# Altium footprint library 方林 封装库.PcbLib: 101 footprints (part 5 of 7)
Each footprint in its own frame and in the unit in brackets; x right, y up, seen from the top. Pads: shape width x height; smd on the part's side, far side on the other; paste and mask are expansions set on the pad; w line width, h text height; cw(c..) or ccw(c..) is an arc to the next point about the centre after c.
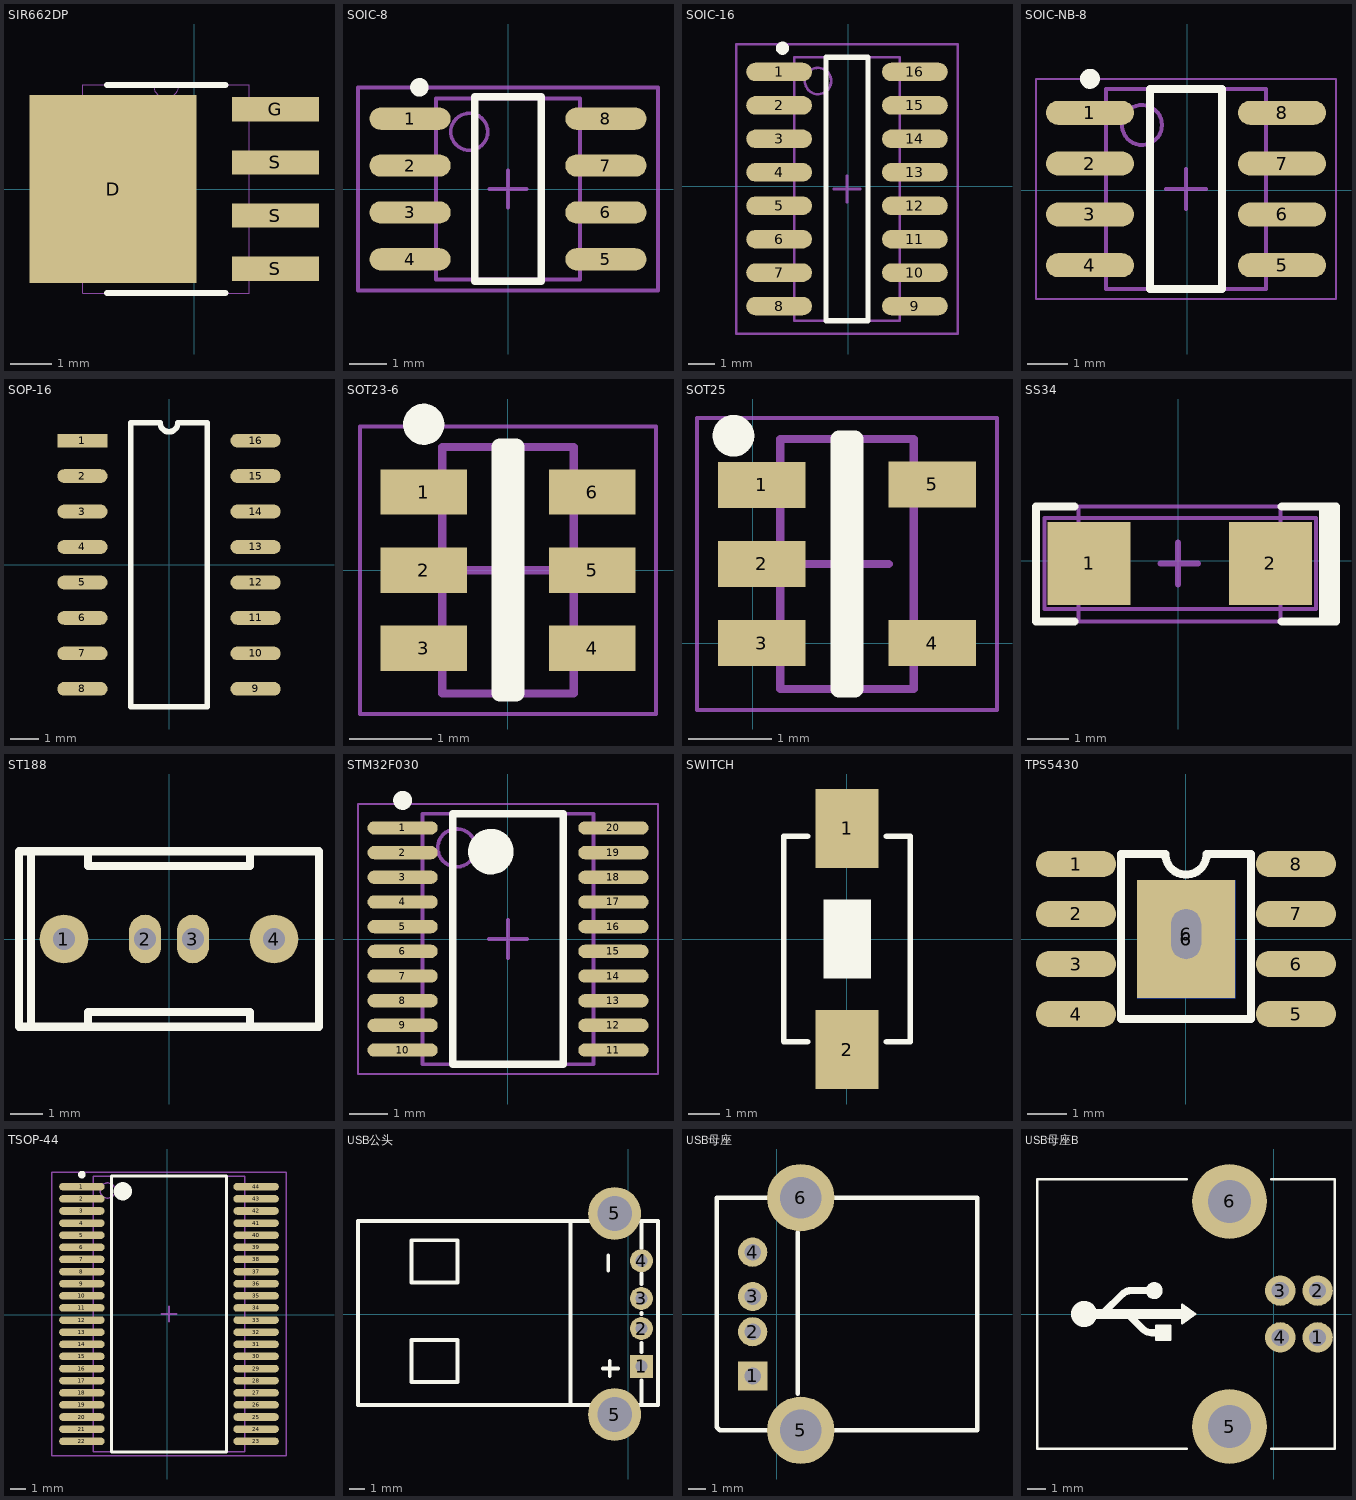
[diagram p4: the footprints below, top view; thin cyan lines are the x and y axes]

## SIR662DP [mil]
pads (5):
  rect 157.48x177.17 smd: D(-76.5,0)
  rect 82x23 smd: G(76.5,75) S(76.5,-75) S(76.5,-25) S(76.5,25)
Top Overlay:
  lines w6: -82.23,-98 29.23,-98 ; -82.23,98 29.23,98
Mechanical 1:
  lines w0: -38.5,98 ccw(c-26.5,98) -14.5,98 ; -148.5,65.5 -148.5,84.5 -105,84.5 -105,65.5 -148.5,65.5 ; -105,-98 52,-98 52,98 -105,98 -105,-98 ; 52,-84.5 52,-65.5 95.5,-65.5 95.5,-84.5 52,-84.5 ; 52,-34.5 52,-15.5 95.5,-15.5 95.5,-34.5 52,-34.5 ; 52,15.5 52,34.5 95.5,34.5 95.5,15.5 52,15.5 ; 52,65.5 52,84.5 95.5,84.5 95.5,65.5 52,65.5

## SOIC-8 [mm]
pads (8):
  oval 2.2x0.6 smd: 1(-2.654,1.905) 2(-2.654,0.635) 3(-2.654,-0.635) 4(-2.654,-1.905) 5(2.654,-1.905) 6(2.654,-0.635) 7(2.654,0.635) 8(2.654,1.905)
Top Overlay:
  circle w0.25: c-2.4,2.755 r0.125
  lines w0.2: -0.9,-2.5 -0.9,2.5 0.9,2.5 0.9,-2.5 -0.9,-2.5
Mechanical 13:
  circle w0.1: c-1.05,1.55 r0.5
  lines w0.1: -1.95,-2.45 -1.95,2.45 1.95,2.45 1.95,-2.45 -1.95,-2.45
Mechanical 15:
  lines w0.1: -0.5,0 0.5,0 ; 0,-0.5 0,0.5 ; -4.064,-2.75 -4.064,2.75 4.064,2.75 4.064,-2.75 -4.064,-2.75
3D body "SO-8.STEP": height 1.7, standoff 0, extent -3,-2.45 3,2.45

## SOIC-16 [mm]
pads (16):
  oval 2.5x0.7 smd: 1(-2.628,4.343) 2(-2.628,3.073) 3(-2.628,1.803) 4(-2.628,0.533) 5(-2.628,-0.737) 6(-2.628,-2.007) 7(-2.628,-3.277) 8(-2.628,-4.547) 9(2.526,-4.547) 10(2.526,-3.277) 11(2.526,-2.007) 12(2.526,-0.737) 13(2.526,0.533) 14(2.526,1.803) 15(2.526,3.073) 16(2.526,4.343)
Top Overlay:
  circle w0.25: c-2.501,5.243 r0.125
  lines w0.2: -0.851,-5.102 -0.851,4.898 0.749,4.898 0.749,-5.102 -0.851,-5.102
Mechanical 13:
  circle w0.1: c-1.151,3.998 r0.5
  lines w0.1: -2.051,-5.102 -2.051,4.898 1.949,4.898 1.949,-5.102 -2.051,-5.102
Mechanical 15:
  lines w0.1: -0.551,-0.102 0.449,-0.102 ; -0.051,-0.602 -0.051,0.398 ; -4.251,-5.602 -4.251,5.398 4.149,5.398 4.149,-5.602 -4.251,-5.602
3D body "User Library-SOIC16-150.STEP": height 1.75, standoff 0, extent -2.93,-5.025 2.87,4.775

## SOIC-NB-8 [mm]
pads (8):
  oval 2.2x0.6 smd: 1(-2.425,1.93) 2(-2.425,0.66) 3(-2.425,-0.61) 4(-2.425,-1.88) 5(2.375,-1.88) 6(2.375,-0.61) 7(2.375,0.66) 8(2.375,1.93)
Top Overlay:
  circle w0.25: c-2.425,2.78 r0.125
  lines w0.2: -0.925,-2.475 -0.925,2.525 0.875,2.525 0.875,-2.475 -0.925,-2.475
Mechanical 13:
  circle w0.1: c-1.125,1.625 r0.5
  lines w0.1: -2.025,-2.475 -2.025,2.525 1.975,2.525 1.975,-2.475 -2.025,-2.475
Mechanical 15:
  lines w0.05: -3.775,-2.725 -3.775,2.775 3.725,2.775 3.725,-2.725 -3.775,-2.725
  lines w0.1: -0.525,0.025 0.475,0.025 ; -0.025,-0.475 -0.025,0.525
3D body: height 2.65, standoff 0.1, extent -2.025,-2.475 1.975,2.525

## SOP-16 [mm]
pads (16):
  rect 1.8x0.49 smd: 1(-3.1,4.445)
  oval 1.8x0.49 smd: 2(-3.1,3.175) 3(-3.1,1.905) 4(-3.1,0.635) 5(-3.1,-0.635) 6(-3.1,-1.905) 7(-3.1,-3.175) 8(-3.1,-4.445) 9(3.1,-4.445) 10(3.1,-3.175) 11(3.1,-1.905) 12(3.1,-0.635) 13(3.1,0.635) 14(3.1,1.905) 15(3.1,3.175) 16(3.1,4.445)
Top Overlay:
  lines w0.2: -1.365,-5.08 -1.365,5.08 -0.318,5.08 ccw(c0,5.08) 0.317,5.08 1.365,5.08 1.365,-5.08 -1.365,-5.08
3D body: height 1, standoff 0, extent -2.565,-5.105 2.489,5.309

## SOT23-6 [mm]
pads (6):
  rect 1.05x0.55 smd: 1(-1.025,0.95) 2(-1.025,0) 3(-1.025,-0.95) 4(1.025,-0.95) 5(1.025,0) 6(1.025,0.95)
Top Overlay:
  circle w0.25: c-1.025,1.775 r0.125
  lines w0.2: -0.1,-1.5 -0.1,1.5 0.1,1.5 0.1,-1.5 -0.1,-1.5
Mechanical 13:
  lines w0.1: -0.8,-1.5 0.8,-1.5 0.8,1.5 -0.8,1.5 -0.8,-1.5
Mechanical 15:
  lines w0.05: -1.8,-1.75 1.8,-1.75 1.8,1.75 -1.8,1.75 -1.8,-1.75
  lines w0.1: -0.5,0 0.5,0 ; 0,-0.5 0,0.5
3D body: height 1.1, standoff 0.05, extent -0.8,-1.5 0.8,1.5

## SOT25 [mm]
pads (5):
  rect 1.05x0.55 smd: 1(0.109,1.9) 2(0.109,0.95) 3(0.109,0) 4(2.159,0) 5(2.159,1.905)
Top Overlay:
  circle w0.25: c-0.229,2.489 r0.125
  lines w0.2: 1.034,-0.55 1.234,-0.55 1.234,2.45 1.034,2.45 1.034,-0.55
Mechanical 13:
  lines w0.1: 0.334,-0.55 1.934,-0.55 1.934,2.45 0.334,2.45 0.334,-0.55
Mechanical 15:
  lines w0.05: -0.666,-0.8 -0.666,2.7 2.934,2.7 2.934,-0.8 -0.666,-0.8
  lines w0.1: 0.634,0.95 1.634,0.95 ; 1.134,0.45 1.134,1.45
3D body: height 1.1, standoff 0.05, extent 0.334,-0.55 1.934,2.45

## SS34 [mm] "肖特基二极管"
pads (2):
  rect 2x2 smd: 1(-2.152,-0.062) 2(2.223,-0.062)
Top Overlay:
  lines w0.2: -2.502,-1.462 -3.431,-1.462 -3.431,1.313 -2.502,1.313 ; 2.498,-1.462 3.504,-1.462 ; 2.498,1.313 3.504,1.313 ; 3.504,-1.462 3.805,-1.462 ; 3.504,-1.462 3.504,1.313 ; 3.504,1.313 3.656,1.16 3.656,-1.313 3.805,-1.462 ; 3.504,1.313 3.805,1.313 3.808,1.309 3.808,-1.459 3.805,-1.462
Mechanical 13:
  lines w0.1: -2.402,-1.462 2.473,-1.462 2.473,1.313 -2.402,1.313 -2.402,-1.462
Mechanical 15:
  lines w0.1: -3.227,-1.162 3.326,-1.162 3.326,1.038 -3.227,1.038 -3.227,-1.162
  lines w0.15: -0.427,-0.062 0.473,-0.062 ; -0.002,-0.562 -0.002,0.438
3D body: height 1.4, standoff 0, extent -2.402,-1.462 2.448,1.313

## ST188 [mm]
pads (4):
  round 1.524 hole 0.7: 1(-3.29,0) 4(3.29,0)
  oval 1x1.524 hole 0.7: 2(-0.75,0) 3(0.75,0)
Top Overlay:
  lines w0.254: -4.318,-2.75 -4.318,2.75 ; -2.54,-2.75 -2.54,-2.286 2.54,-2.286 2.54,-2.75 ; -2.54,2.75 -2.54,2.286 2.54,2.286 2.54,2.75 ; -4.7,-2.75 4.7,-2.75 4.7,2.75 -4.7,2.75 -4.7,-2.75

## STM32F030 [mm]
pads (20):
  oval 1.85x0.35 smd: 1(-2.775,2.925) 2(-2.775,2.275) 3(-2.775,1.625) 4(-2.775,0.975) 5(-2.775,0.325) 6(-2.775,-0.325) 7(-2.775,-0.975) 8(-2.775,-1.625) 9(-2.775,-2.275) 10(-2.775,-2.925) 11(2.775,-2.925) 12(2.775,-2.275) 13(2.775,-1.625) 14(2.775,-0.975) 15(2.775,-0.325) 16(2.775,0.325) 17(2.775,0.975) 18(2.775,1.625) 19(2.775,2.275) 20(2.775,2.925)
Top Overlay:
  circle w0.6: c-0.45,2.3 r0.3
  circle w0.25: c-2.775,3.65 r0.125
  lines w0.2: -1.45,-3.3 1.45,-3.3 1.45,3.3 -1.45,3.3 -1.45,-3.3
Mechanical 13:
  circle w0.1: c-1.35,2.4 r0.5
  lines w0.1: -2.25,-3.3 2.25,-3.3 2.25,3.3 -2.25,3.3 -2.25,-3.3
Mechanical 15:
  lines w0.05: -3.95,-3.55 3.95,-3.55 3.95,3.55 -3.95,3.55 -3.95,-3.55
  lines w0.1: -0.5,0 0.5,0 ; 0,-0.5 0,0.5
3D body: height 1.2, standoff 0.1, extent -2.25,-3.3 2.25,3.3

## SWITCH [mm]
pads (2):
  rect 2x2.5 smd: 1(0,3.5) 2(0,-3.5)
Top Overlay:
  region: -0.747,1.253 -0.747,-1.247 0.753,-1.247 0.753,1.253
  lines w0.178: -1.25,-3.25 -2,-3.246 -2,3.25 -1.25,3.25 ; 1.25,-3.25 2,-3.25 2,3.25 1.25,3.25
3D body: height 0.8, standoff 0, extent -2.032,-3.231 2.032,3.246
3D body: height 1.2, standoff 0.8, extent -0.762,-1.199 0.762,1.214

## TPS5430 [mil]
pads (11):
  oval 80x26 smd: 1(-110,75) 2(-110,25) 3(-110,-25) 4(-110,-75) 5(110,-75) 6(110,-25) 7(110,25) 8(110,75)
  rect 98x118 smd: 6(0,0)
  rect 98x118 smd far side: 6(0,0)
  oval 50x70 hole 30 slot 50 at 90 deg: 6(0,5)
Top Overlay:
  lines w8: -65,-80 65,-80 65,85 20.62,85 cw(c0,85) -20.62,85 -65,85 -65,-80
3D body: height 30, standoff 0, extent -70,-90 70,90

## TSOP-44 [mm]
pads (44):
  oval 3x0.5 smd: 1(-5.648,8.451) 2(-5.648,7.651) 3(-5.648,6.851) 4(-5.648,6.051) 5(-5.648,5.251) 6(-5.648,4.451) 7(-5.648,3.651) 8(-5.648,2.851) 9(-5.648,2.051) 10(-5.648,1.251) 11(-5.648,0.451) 12(-5.648,-0.349) 13(-5.648,-1.149) 14(-5.648,-1.949) 15(-5.648,-2.749) 16(-5.648,-3.549) 17(-5.648,-4.349) 18(-5.648,-5.149) 19(-5.648,-5.949) 20(-5.648,-6.749) 21(-5.648,-7.549) 22(-5.648,-8.349) 23(5.852,-8.349) 24(5.852,-7.549) 25(5.852,-6.749) 26(5.852,-5.949) 27(5.852,-5.149) 28(5.852,-4.349) 29(5.852,-3.549) 30(5.852,-2.749) 31(5.852,-1.949) 32(5.852,-1.149) 33(5.852,-0.349) 34(5.852,0.451) 35(5.852,1.251) 36(5.852,2.051) 37(5.852,2.851) 38(5.852,3.651) 39(5.852,4.451) 40(5.852,5.251) 41(5.852,6.051) 42(5.852,6.851) 43(5.852,7.651) 44(5.852,8.451)
Top Overlay:
  circle w0.6: c-2.948,8.151 r0.3
  circle w0.25: c-5.648,9.251 r0.125
  lines w0.2: -3.708,-9.049 3.912,-9.049 3.912,9.151 -3.708,9.151 -3.708,-9.049
Mechanical 13:
  circle w0.1: c-3.948,8.201 r0.5
  lines w0.1: -4.898,-9.049 5.102,-9.049 5.102,9.151 -4.898,9.151 -4.898,-9.049
Mechanical 15:
  lines w0.1: -0.398,0.051 0.602,0.051 ; 0.102,-0.449 0.102,0.551 ; -7.645,-9.299 7.849,-9.299 7.849,9.401 -7.645,9.401 -7.645,-9.299
3D body: height 1.2, standoff 0.2, extent -4.898,-9.049 5.102,9.151

## USB公头 [mil]
pads (6):
  rect 60x60 hole 31.5: 1(35,-136.5)
  round 60 hole 31.5: 2(35,-38.08) 3(35,40.66) 4(35,139.09)
  round 137.8 hole 90.55: 5(-35,-262.5) 5(-35,262.5)
Top Overlay:
  lines w10: -150,-237.5 -150,237.5 ; -65,-142.5 -25.63,-142.5 ; -51.61,113.5 -51.61,152.87 ; -47.68,-162.09 -47.68,-122.72 ; 35,-237.5 35,-173.9 ; 35,-99.1 35,-75.48 ; 35,-0.67 35,3.26 ; 35,78.07 35,105.63 ; 35,172.55 35,242.5 ; -705,-237.5 -705,242.5 78.31,242.5 78.31,-237.5 -705,-237.5 ; -565,-177.5 -445,-177.5 -445,-67.5 -565,-67.5 -565,-177.5 ; -565,82.5 -565,192.5 -445,192.5 -445,82.5 -565,82.5
3D body: height 90, standoff 0, extent -705,-237.5 35,242.5
3D body: height 90.5, standoff 0, extent -565,82.5 -445,192.5
3D body: height 90.5, standoff 0, extent -565,-177.5 -445,-67.5
3D body: height 90.5, standoff 0, extent -255,-2.5 -220,17.5
3D body: height 50, standoff 0, extent 25,107.5 55,167.5
3D body: height 50, standoff 0, extent 25,7.5 55,72.5
3D body: height 50, standoff 0, extent 25,-67.5 55,-7.5
3D body: height 50, standoff 0, extent 25,-167.5 55,-102.5
3D body: height 50, standoff 0, extent -80,237.5 10,262.5
3D body: height 50, standoff 0, extent -80,-257.5 10,-227.5
3D body: height 80, standoff 10, extent -710,-227.5 -685,232.5

## USB母座 [mil]
pads (6):
  rect 65x65 hole 37: 1(-53.5,-138)
  round 65 hole 37: 2(-53.5,-39.5) 3(-53.5,39) 4(-53.5,137.6)
  round 150 hole 93: 5(53.5,-259) 6(53.5,259)
Top Overlay:
  lines w10: 46.5,-178 46.5,182 ; -133.5,-252 -133.5,259 53.5,259 446.5,259 446.5,-259 53.5,-259 -126.5,-259 -133.5,-252
3D body "User Library-USB-A-01.step": height 274.23, standoff -164.75, extent -98.5,-311.02 440.87,311.02

## USB母座B [mm]
pads (6):
  round 1.626 hole 0.914: 1(2.355,-1.25) 2(2.355,1.25) 3(0.355,1.25) 4(0.355,-1.25)
  round 4 hole 2.3: 5(-2.355,-6.02) 6(-2.355,6.02)
Top Overlay:
  circle w0.889: c-10.135,0 r0.254
  circle w0.508: c-6.385,1.25 r0.2
  region: -4.185,0 -4.885,-0.5 -4.885,0.5
  region: -5.535,-1.375 -6.285,-1.375 -6.285,-0.625 -5.535,-0.625
  lines w0.127: -4.635,-7.2 -12.635,-7.2 -12.635,7.2 -4.635,7.2 ; -0.135,-7.2 3.265,-7.2 3.265,7.2 -0.135,7.2 ; -6.285,-1.375 -6.285,-0.625 -5.535,-0.625 -5.535,-1.375 -6.285,-1.375 ; -4.885,-0.5 -4.185,0 -4.885,0.5 -4.885,-0.5
  lines w0.381: -9.088,0.062 -8.088,1.062 cw(c-7.635,0.61) -7.635,1.25 -6.385,1.25 ; -7.738,-0.062 -6.988,-0.812 ccw(c-6.535,-0.36) -6.535,-1 -6.285,-1
  lines w0.508: -9.635,0 -4.885,0
3D body "c-0292304-01-b-3d.stp": height 11.5, standoff -3.93, extent -12.635,-7.194 3.065,7.194